# Altium footprint library led.PcbLib: 30 footprints (part 1 of 2)
Each footprint in its own frame and in the unit in brackets; x right, y up, seen from the top. Pads: shape width x height; smd on the part's side, far side on the other; paste and mask are expansions set on the pad; w line width, h text height; cw(c..) or ccw(c..) is an arc to the next point about the centre after c.
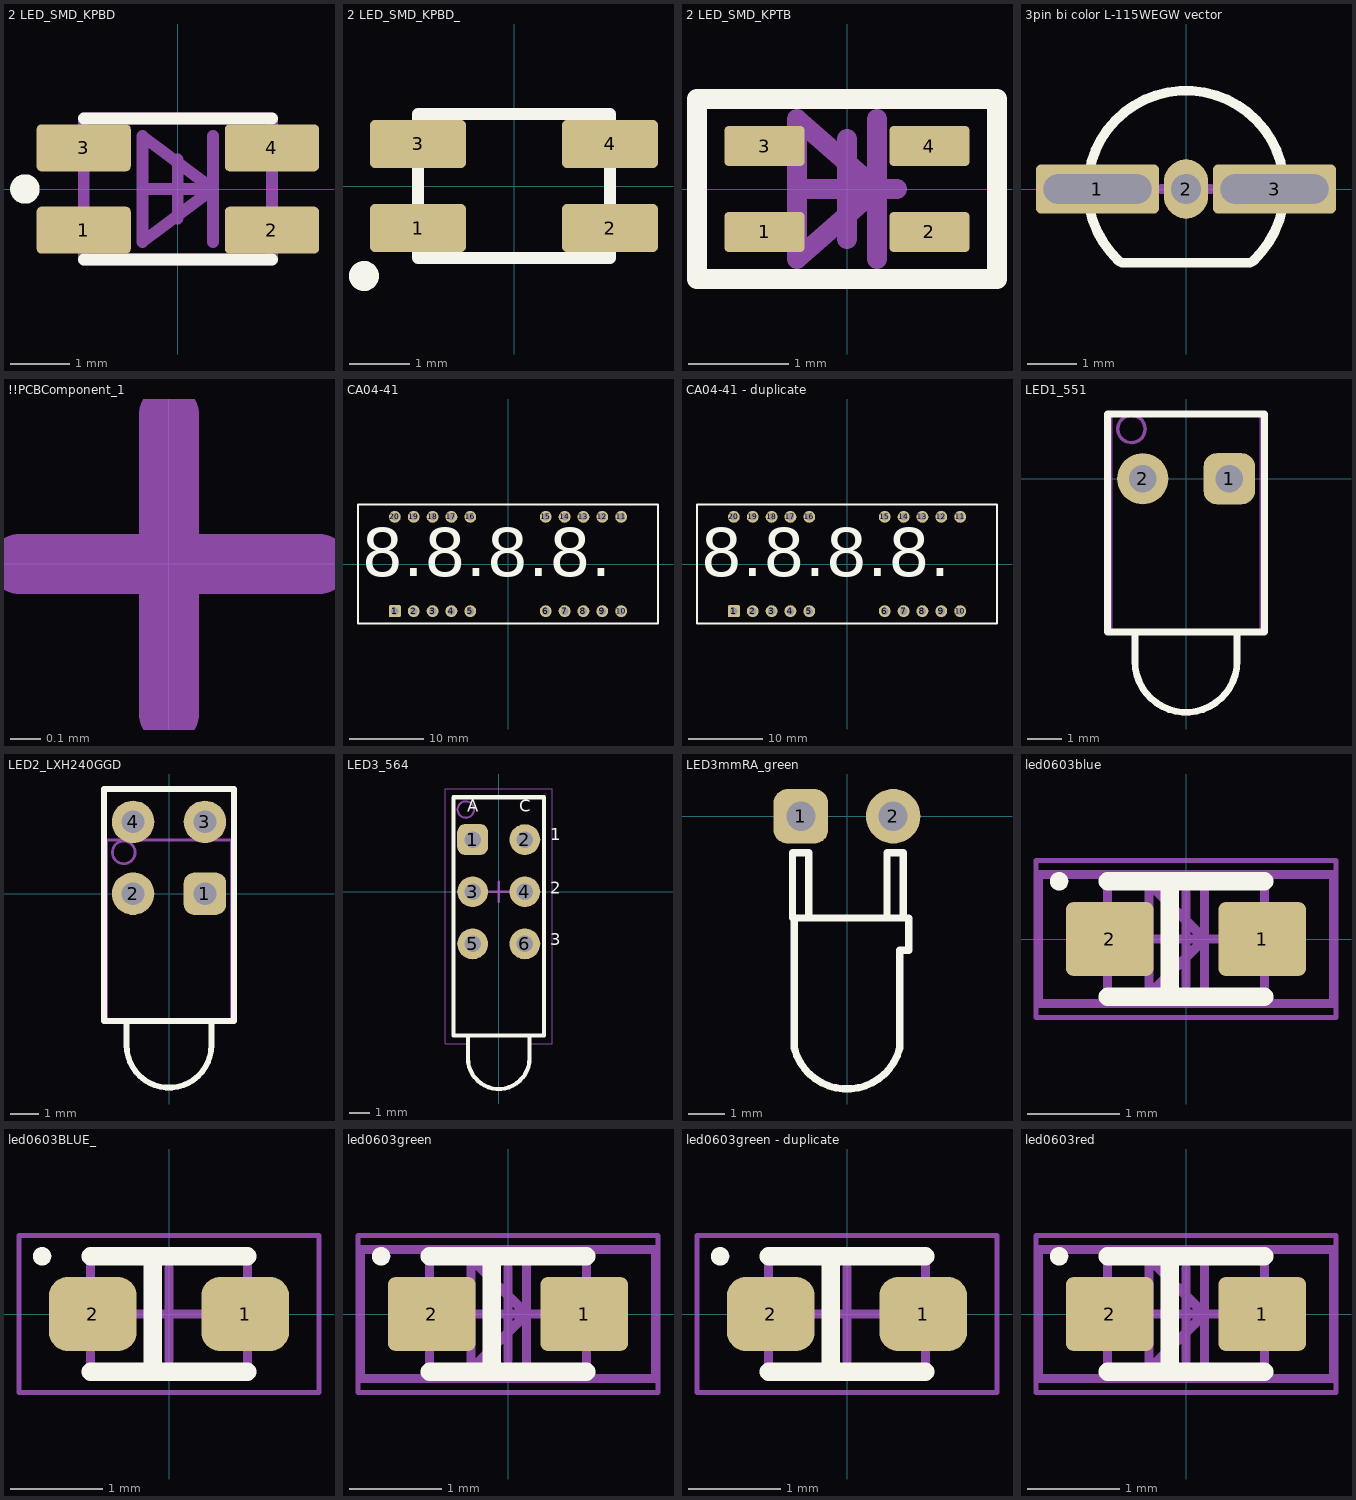
[diagram p0: the footprints below, top view; thin cyan lines are the x and y axes]

## 2 LED_SMD_KPBD [mm] "KPBD-3224ESGC"
height 5
pads (4):
  rrect20% 1.6x0.8 smd mask+0.1: 1(-1.6,-0.7) 2(1.6,-0.7) 3(-1.6,0.7) 4(1.6,0.7)
Top Overlay:
  circle w0.3: c-2.6,0 r0.1
  lines w0.2: -1.6,-1.2 1.6,-1.2 ; -1.6,1.2 1.6,1.2
M3_comm_top:
  text ".comment" at -0.9,-0.3 h1
M5_asm_top:
  lines w0.2: 0.6,-0.9 0.6,0.9 ; -1.6,-1.2 1.6,-1.2 1.6,1.2 -1.6,1.2 -1.6,-1.2 ; -0.6,-0.9 -0.6,0.9 0.6,0 -0.6,-0.9
  text ".Designator" at -1,1.3 h1
M7_courtyard_top:
  lines w0.2: -0.5,0 0.5,0 ; 0,-0.5 0,0.5
3D body "Диод SMD.STEP": height 2.43, standoff 0.03, extent -1.6,-1.2 1.6,1.2

## 2 LED_SMD_KPBD_ [mm] "KPBD-3224ESGC"
height 5
pads (4):
  rrect20% 1.6x0.8 smd mask+0.1: 1(-1.6,-0.7) 2(1.6,-0.7) 3(-1.6,0.7) 4(1.6,0.7)
Top Overlay:
  circle w0.3: c-2.5,-1.5 r0.1
  lines w0.2: -1.6,-1.2 1.6,-1.2 1.6,1.2 -1.6,1.2 -1.6,-1.2
3D body: height 0.51, standoff 0.5, extent 1,-0.3 1.6,0.3
3D body: height 0.5, standoff 0.05, extent -1.6,-1.2 1.6,1.2
3D body: height 1, standoff 0.5, extent -1,-1.2 1,1.2
3D body: height 2.4, standoff 0.6, extent -0.9,-0.897 0.9,0.897
3D body: height 1.5, standoff 1, extent -0.893,-0.898 0.9,0.898

## 2 LED_SMD_KPTB [mm] "KPTB-1612ESGC"
height 5
pads (4):
  rrect20% 0.8x0.4 smd mask+0.1: 1(-0.825,-0.43) 2(0.825,-0.43) 3(-0.825,0.43) 4(0.825,0.43)
Top Overlay:
  lines w0.2: -1.5,-0.9 1.5,-0.9 1.5,0.9 -1.5,0.9 -1.5,-0.9
M3_comm_top:
  text ".comment" at -0.9,-0.3 h1
M5_asm_top:
  lines w0.2: 0.3,-0.7 0.3,0.7 ; -1.5,-0.9 -1.5,0.9 1.5,0.9 1.5,-0.9 -1.5,-0.9 ; -0.5,-0.7 0.3,0 -0.5,0.7 -0.5,-0.7
  text ".Designator" at -1,1.3 h1
M7_courtyard_top:
  lines w0.2: -0.5,0 0.5,0 ; 0,-0.5 0,0.5 ; -1.5,-0.9 -1.5,0.9 1.5,0.9 1.5,-0.9 -1.5,-0.9
3D body "User Library-KPTB-1615SURKSGC.step": height 0.7, standoff -0.01, extent -0.8,-0.75 0.8,0.75

## 3pin bi color L-115WEGW vector [mm] "L-115WEGW"
height 0.025
pads (3):
  rrect20% 2.5x1 hole 0.6 slot 2.2 at 0 deg: 1(-1.8,0) 3(1.8,0)
  oval 0.9x1.2 hole 0.6: 2(0,0)
Top Overlay:
  lines w0.2: -1.365,-1.462 cw(c0,0) 1.365,-1.462 ; -1.3,-1.5 1.3,-1.5
M3_comm_top:
  text ".comment" at -1.5,-1.5 h1
M5_asm_top:
  text ".Designator" at -1,1.3 h1
M7_courtyard_top:
  lines w0.2: -0.5,0 0.5,0 ; 0,-0.5 0,0.5
3D body "L-115WEGW-CA.STEP": height 5.13, standoff -6.9, extent -2.79,-1.5 2.79,2

## !!PCBComponent_1 [mm]
M3_comm_top:
  text ".comment" at -0.9,-0.3 h1
M5_asm_top:
  text ".Designator" at -1,1.3 h1
M7_courtyard_top:
  lines w0.2: -0.5,0 0.5,0 ; 0,-0.5 0,0.5

## CA04-41 [mm] "kingbright 0.4\" QUAD DIGIT RED GREEN YELLOW LED DISPLAY 4-Digit 7-Segment Thru-Hole Display"
height 11.4
pads (20):
  rrect20% 1.6x1.6 hole 1: 1(-15.24,-6.35)
  round 1.6 hole 1: 2(-12.7,-6.35) 3(-10.16,-6.35) 4(-7.62,-6.35) 5(-5.08,-6.35) 6(5.08,-6.35) 7(7.62,-6.35) 8(10.16,-6.35) 9(12.7,-6.35) 10(15.24,-6.35) 11(15.24,6.35) 12(12.7,6.35) 13(10.16,6.35) 14(7.62,6.35) 15(5.08,6.35) 16(-5.08,6.35) 17(-7.62,6.35) 18(-10.16,6.35) 19(-12.7,6.35) 20(-15.24,6.35)
Top Overlay:
  lines w0.254: -20.2,-8 -20.2,8 20.2,8 20.2,-8 -20.2,-8
  text "8.8.8.8." at -19.685,-3.81 h11
  text "." at -18.415,-6.985 h11
M3_comm_top:
  text ".comment" at -3.81,-5.08 h1.52
3D body "King Bright CA04-41.step": height 6.9, standoff -4.1, extent -20.2,-8 20.2,8

## CA04-41 - duplicate [mm] "kingbright 0.4\" QUAD DIGIT RED GREEN YELLOW LED DISPLAY 4-Digit 7-Segment Thru-Hole Display"
height 11.4
pads (20):
  rrect20% 1.6x1.6 hole 1: 1(-15.24,-6.35)
  round 1.6 hole 1: 2(-12.7,-6.35) 3(-10.16,-6.35) 4(-7.62,-6.35) 5(-5.08,-6.35) 6(5.08,-6.35) 7(7.62,-6.35) 8(10.16,-6.35) 9(12.7,-6.35) 10(15.24,-6.35) 11(15.24,6.35) 12(12.7,6.35) 13(10.16,6.35) 14(7.62,6.35) 15(5.08,6.35) 16(-5.08,6.35) 17(-7.62,6.35) 18(-10.16,6.35) 19(-12.7,6.35) 20(-15.24,6.35)
Top Overlay:
  lines w0.254: -20.2,-8 20.2,-8 20.2,8 -20.2,8 -20.2,-8
  text "." at -18.415,-6.985 h11
  text "8.8.8.8." at -19.685,-3.81 h11
3D body "King Bright CA04-41.step": height 6.9, standoff -4.1, extent -20.2,-8 20.2,8

## LED1_551 [mm] "551-1107F, LED-301 (LED-1F)"
height 0.025
pads (2):
  rrect50% 1.5x1.5 hole 0.8: 1(1.27,0)
  round 1.5 hole 0.8: 2(-1.27,0)
Top Overlay:
  lines w0.2: -1.5,-4.5 -1.5,-5.35 ccw(c0,-5.35) 1.5,-5.35 1.5,-4.5
  lines w0.203: -2.3,-4.5 -2.3,1.9 2.3,1.9 2.3,-4.5 -2.3,-4.5
Mechanical 13:
  circle w0.1: c-1.6,1.46 r0.4
  lines w0.1: -2.2,-4.5 -2.2,1.9 2.2,1.9 2.2,-4.5 1.5,-4.5 1.5,-5.4 cw(c0,-5.4) -1.5,-5.4 -1.5,-4.5 -2.2,-4.5
3D body "SW3dPS-LEDd3GC.STEP": height 7.31, standoff -2.49, extent -2.311,-6.854 2.312,1.905

## LED2_LXH240GGD [mm] "SSF-LXH240GGD"
height 0.025
pads (4):
  rrect50% 1.5x1.5 hole 0.8: 1(1.27,0)
  round 1.5 hole 0.8: 2(-1.27,0) 3(1.27,2.54) 4(-1.27,2.54)
Top Overlay:
  lines w0.2: -1.5,-4.5 -1.5,-5.35 ccw(c0,-5.35) 1.5,-5.35 1.5,-4.5
  lines w0.203: -2.3,-4.5 -2.3,3.7 2.3,3.7 2.3,-4.5 -2.3,-4.5
Mechanical 13:
  circle w0.1: c-1.6,1.46 r0.4
  lines w0.1: -2.2,-4.5 -2.2,1.9 2.2,1.9 2.2,-4.5 1.5,-4.5 1.5,-5.4 cw(c0,-5.4) -1.5,-5.4 -1.5,-4.5 -2.2,-4.5
3D body "User Library-Lumex SSF-LXH240GGD.step": height 9.82, standoff -3.01, extent -2.16,-7.095 2.16,3.675

## LED3_564 [mm]
pads (6):
  rrect50% 1.5x1.5 hole 0.8: 1(-1.27,2.54)
  round 1.5 hole 0.8: 2(1.27,2.54) 3(-1.27,0) 4(1.27,0) 5(-1.27,-2.54) 6(1.27,-2.54)
Top Overlay:
  lines w0.2: -1.5,-7 -1.5,-8.1 ccw(c0,-8.1) 1.5,-8.1 1.5,-7 ; -2.2,-7 -2.2,4.6 2.2,4.6 2.2,-7 -2.2,-7
  text "3" at 2.5,-2.8 h1
  text "2" at 2.5,-0.3 h1
  text "1" at 2.5,2.3 h1
  text "A" at -1.54,3.7 h1
  text "C" at 1,3.7 h1
Mechanical 13:
  circle w0.1: c-1.6,4 r0.4
  lines w0.1: -2.2,-7 -1.5,-7 -1.5,-8.1 ccw(c0,-8.1) 1.5,-8.1 1.5,-7 2.2,-7 2.2,4.6 -2.2,4.6 -2.2,-7
Mechanical 15:
  lines w0.05: -2.6,-7.4 -2.6,5 2.6,5 2.6,-7.4 1.5,-7.4 1.5,-8.1 cw(c0,-8.1) -1.5,-8.1 -1.5,-7.4 -2.6,-7.4
  lines w0.1: -0.5,0 0.5,0 ; 0,-0.5 0,0.5
3D body "LED3_Dialight_564-0200-132F.step": height 15.25, standoff -3.89, extent -2.159,-9.657 2.161,4.6

## LED3mmRA_green [mm] "WP710A10SRC/E"
height 0.025
pads (2):
  rrect50% 1.5x1.5 hole 0.8: 1(-1.27,0)
  round 1.5 hole 0.8: 2(1.27,0)
Top Overlay:
  lines w0.2: -1.5,-2.8 -1.5,-1 -1.05,-1 -1.05,-2.8 ; 1.1,-2.8 1.1,-1 1.55,-1 1.55,-2.8 ; -1.449,-6.386 ccw(c0,-6) 1.449,-6.386 1.449,-3.686 1.7,-3.686 1.7,-2.8 -1.449,-2.8 -1.449,-3.686 -1.449,-6.386
3D body "User Library-LED_d3-GRN.STEP": height 1.95, standoff -1.34, extent -1.519,-7.475 1.694,0

## led0603blue [mm] "IPC Low Density"
height 1.1
pads (2):
  rrect20% 0.95x0.8 smd: 1(0.825,0) 2(-0.825,0)
Top Overlay:
  circle w0.1: c-1.375,0.625 r0.05
  lines w0.2: -0.85,-0.625 0.85,-0.625 ; -0.85,0.625 0.85,0.625 ; -0.175,-0.625 -0.175,0.625
M3_comm_top:
  text ".comment" at -0.9,-0.3 h1
M5_asm_top:
  lines w0.1: -1.1,0 0.9,0 ; 0.2,-0.6 0.2,0.6 ; -0.4,-0.6 0.2,0 -0.4,0.6 -0.4,-0.6
  text ".Designator" at -1,1.3 h1
M7_courtyard_top:
  lines w0.1: -0.5,0 0.5,0 ; 0,-0.5 0,0.5 ; -1.6,-0.7 1.6,-0.7 1.6,0.7 -1.6,0.7 -1.6,-0.7
Mechanical 13:
  lines w0.1: -0.85,-0.625 0.85,-0.625 0.85,0.625 -0.85,0.625 -0.85,-0.625
Mechanical 15:
  lines w0.05: -1.625,-0.85 1.625,-0.85 1.625,0.85 -1.625,0.85 -1.625,-0.85
  lines w0.1: -0.5,0 0.5,0 ; 0,-0.5 0,0.5
3D body "User Library-LTST-C190TBKT.STEP": height 0.9, standoff 0, extent -0.85,-0.45 0.85,0.45

## led0603BLUE_ [mm] "SOD323, IPC Low Density"
height 1.1
pads (2):
  rrect50% 0.95x0.8 smd: 1(0.825,0) 2(-0.825,0)
Top Overlay:
  circle w0.1: c-1.375,0.625 r0.05
  lines w0.2: -0.85,-0.625 0.85,-0.625 ; -0.85,0.625 0.85,0.625 ; -0.175,-0.625 -0.175,0.625
Mechanical 13:
  lines w0.1: -0.85,-0.625 -0.85,0.625 0.85,0.625 0.85,-0.625 -0.85,-0.625
Mechanical 15:
  lines w0.05: -1.625,-0.85 -1.625,0.85 1.625,0.85 1.625,-0.85 -1.625,-0.85
  lines w0.1: -0.5,0 0.5,0 ; 0,-0.5 0,0.5
3D body "User Library-LTST-C190TBKT.STEP": height 0.9, standoff 0, extent -0.85,-0.45 0.85,0.45

## led0603green [mm] "IPC Low Density"
height 1.1
pads (2):
  rrect20% 0.95x0.8 smd: 1(0.825,0) 2(-0.825,0)
Top Overlay:
  circle w0.1: c-1.375,0.625 r0.05
  lines w0.2: -0.85,-0.625 0.85,-0.625 ; -0.85,0.625 0.85,0.625 ; -0.175,-0.625 -0.175,0.625
M3_comm_top:
  text ".comment" at -0.9,-0.3 h1
M5_asm_top:
  lines w0.1: -1.1,0 0.9,0 ; 0.2,-0.6 0.2,0.6 ; -0.4,-0.6 0.2,0 -0.4,0.6 -0.4,-0.6
  text ".Designator" at -1,1.3 h1
M7_courtyard_top:
  lines w0.1: -0.5,0 0.5,0 ; 0,-0.5 0,0.5 ; -1.6,-0.7 -1.6,0.7 1.6,0.7 1.6,-0.7 -1.6,-0.7
Mechanical 13:
  lines w0.1: -0.85,-0.625 -0.85,0.625 0.85,0.625 0.85,-0.625 -0.85,-0.625
Mechanical 15:
  lines w0.05: -1.625,-0.85 -1.625,0.85 1.625,0.85 1.625,-0.85 -1.625,-0.85
  lines w0.1: -0.5,0 0.5,0 ; 0,-0.5 0,0.5
3D body "led0603_GRE.step": height 1.15, standoff 0.05, extent -0.81,-0.4 0.81,0.4

## led0603green - duplicate [mm] "SOD323, IPC Low Density"
height 1.1
pads (2):
  rrect50% 0.95x0.8 smd: 1(0.825,0) 2(-0.825,0)
Top Overlay:
  circle w0.1: c-1.375,0.625 r0.05
  lines w0.2: -0.85,-0.625 0.85,-0.625 ; -0.85,0.625 0.85,0.625 ; -0.175,-0.625 -0.175,0.625
Mechanical 13:
  lines w0.1: -0.85,-0.625 0.85,-0.625 0.85,0.625 -0.85,0.625 -0.85,-0.625
Mechanical 15:
  lines w0.05: -1.625,-0.85 1.625,-0.85 1.625,0.85 -1.625,0.85 -1.625,-0.85
  lines w0.1: -0.5,0 0.5,0 ; 0,-0.5 0,0.5
3D body "led0603_GRE.step": height 1.15, standoff 0.05, extent -0.81,-0.4 0.81,0.4

## led0603red [mm] "IPC Low Density"
height 1.1
pads (2):
  rrect20% 0.95x0.8 smd: 1(0.825,0) 2(-0.825,0)
Top Overlay:
  circle w0.1: c-1.375,0.625 r0.05
  lines w0.2: -0.85,-0.625 0.85,-0.625 ; -0.85,0.625 0.85,0.625 ; -0.175,-0.625 -0.175,0.625
M3_comm_top:
  text ".comment" at -0.9,-0.3 h1
M5_asm_top:
  lines w0.1: -1.1,0 0.9,0 ; 0.2,-0.6 0.2,0.6 ; -0.4,-0.6 -0.4,0.6 0.2,0 -0.4,-0.6
  text ".Designator" at -1,1.3 h1
M7_courtyard_top:
  lines w0.1: -0.5,0 0.5,0 ; 0,-0.5 0,0.5 ; -1.6,-0.7 -1.6,0.7 1.6,0.7 1.6,-0.7 -1.6,-0.7
Mechanical 13:
  lines w0.1: -0.85,-0.625 -0.85,0.625 0.85,0.625 0.85,-0.625 -0.85,-0.625
Mechanical 15:
  lines w0.05: -1.625,-0.85 -1.625,0.85 1.625,0.85 1.625,-0.85 -1.625,-0.85
  lines w0.1: -0.5,0 0.5,0 ; 0,-0.5 0,0.5
3D body "led0603_GRE.step": height 1.15, standoff 0.05, extent -0.81,-0.4 0.81,0.4